# Altium footprint library My Footprint.PcbLib: 268 footprints (part 15 of 17)
Each footprint in its own frame and in the unit in brackets; x right, y up, seen from the top. Pads: shape width x height; smd on the part's side, far side on the other; paste and mask are expansions set on the pad; w line width, h text height; cw(c..) or ccw(c..) is an arc to the next point about the centre after c.
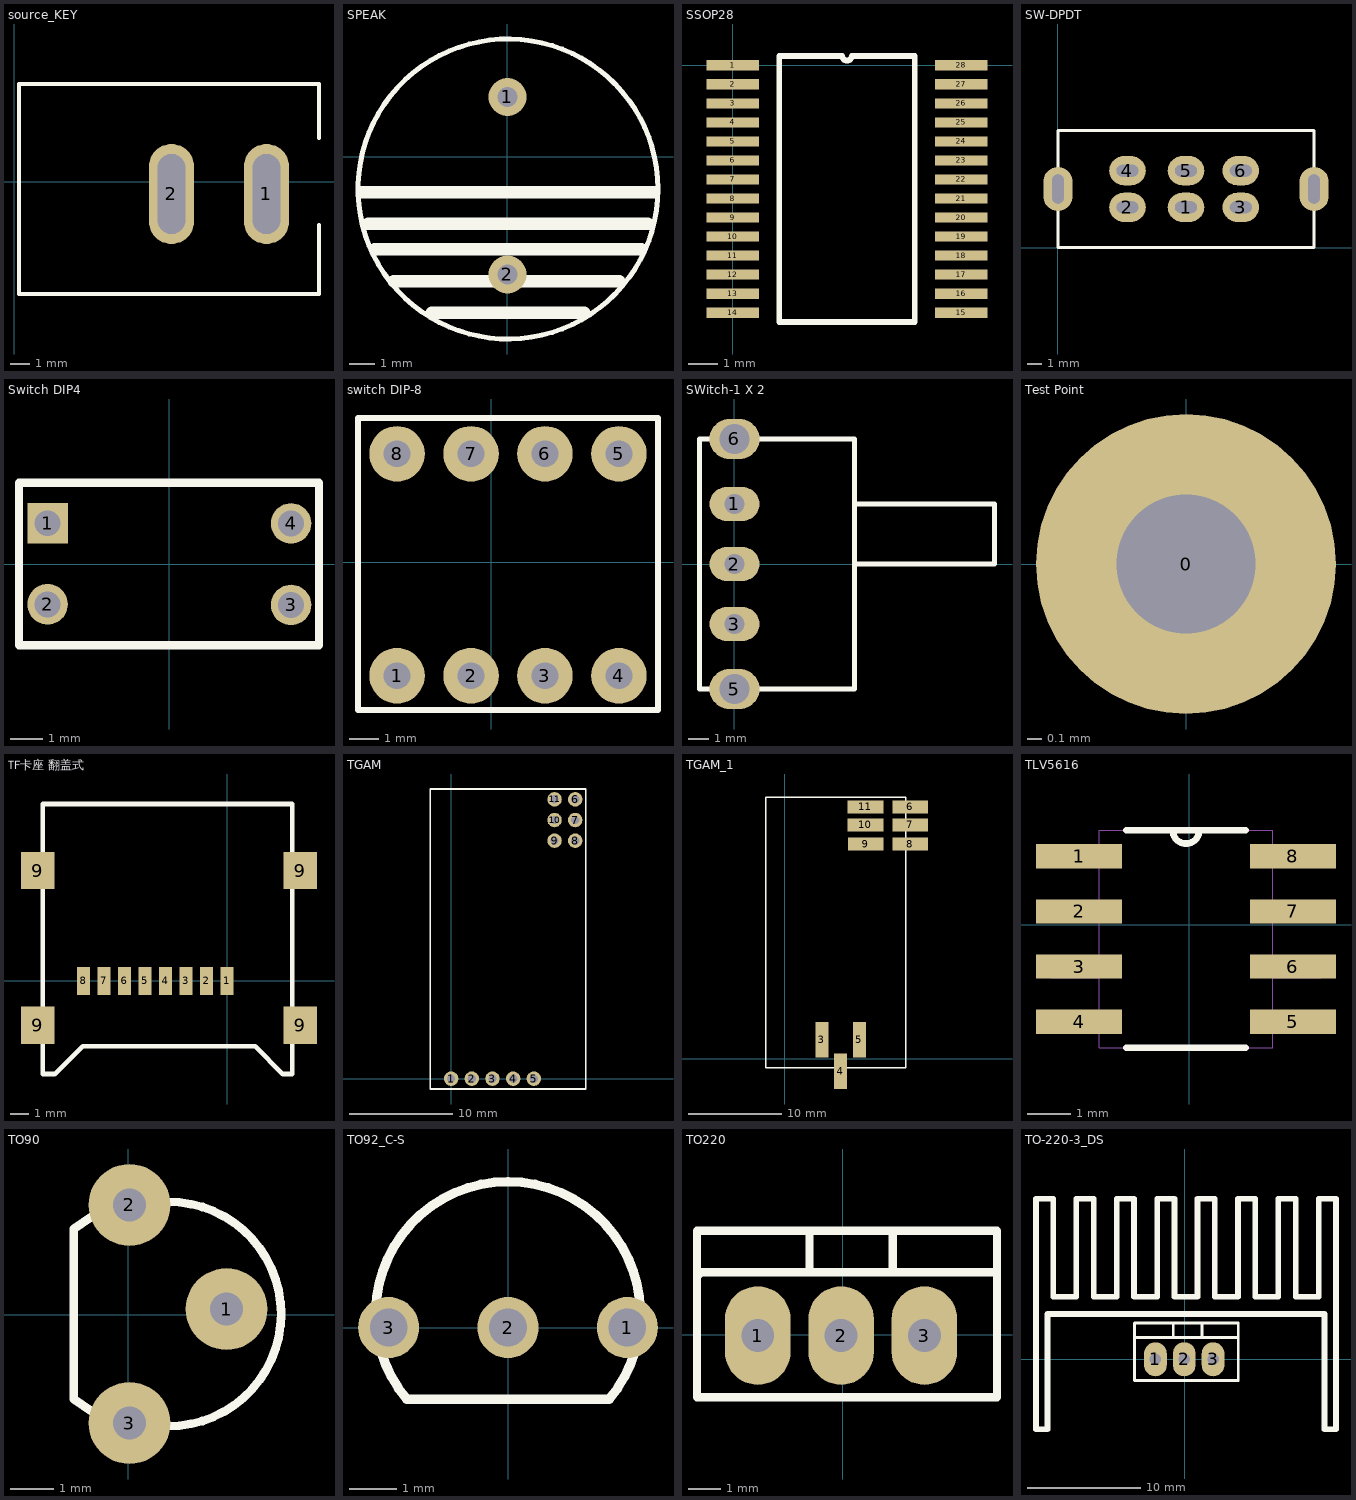
[diagram p14: the footprints below, top view; thin cyan lines are the x and y axes]

## source_KEY [mil] "电源开关"
height 68.9
pads (2):
  oval 90x200 hole 55 slot 160 at 90 deg: 1(505,-25) 2(315,-25)
Top Overlay:
  lines w7.87: 326.77,-225 10,-225 10,195 610,195 610,86.61 ; 330,-225 610,-225 610,-86.61
Mechanical 1:
  lines w39.37: 315.28,-64.37 315.28,14.37 ; 505,-73.43 505,25
Mechanical 2:
  lines w79.37: 315.28,-64.37 315.28,14.37 ; 505,-75 505,23.43
3D body "User Library-KCD11.STEP": height 552.52, standoff -195.91, extent 13.57,-223.39 606.43,190

## SPEAK [mil]
pads (2):
  round 60 hole 31.5: 1(0,94.49) 2(0,-185)
Top Overlay:
  circle w7.87: c0.84,-50.42 r236.22
  lines w19.68: -229.16,-55.43 230.84,-55.43 ; -219.16,-105.43 220.84,-105.43 ; -209.16,-145.43 210.84,-145.43 ; -179.16,-195.43 175.84,-195.43 ; -119.16,-245.43 120.84,-245.43
3D body "D7_12.STEP": height 354.33, standoff -78.74, extent -236.24,-281.22 236.21,191.22

## SSOP28 [mm]
pads (28):
  rect 1.8x0.35 smd: 1(0,0) 2(0,-0.65) 3(0,-1.3) 4(0,-1.95) 5(0,-2.6) 6(0,-3.25) 7(0,-3.9) 8(0,-4.55) 9(0,-5.2) 10(0,-5.85) 11(0,-6.5) 12(0,-7.15) 13(0,-7.8) 14(0,-8.45) 15(7.8,-8.45) 16(7.8,-7.8) 17(7.8,-7.15) 18(7.8,-6.5) 19(7.8,-5.85) 20(7.8,-5.2) 21(7.8,-4.55) 22(7.8,-3.9) 23(7.8,-3.25) 24(7.8,-2.6) 25(7.8,-1.95) 26(7.8,-1.3) 27(7.8,-0.65) 28(7.8,0)
Top Overlay:
  lines w0.2: 1.585,-8.775 1.585,0.325 3.738,0.325 ccw(c3.9,0.325) 4.062,0.325 6.215,0.325 6.215,-8.775 1.585,-8.775
3D body "TSSOP-28.STEP": height 1.03, standoff 0.04, extent 0.737,-9.092 7.137,0.608

## SW-DPDT [mm]
pads (8):
  oval 2.5x2 hole 0.8 slot 1.5 at 0 deg: 1(8.75,2.75) 2(4.75,2.75) 3(12.5,2.75) 4(4.75,5.25) 5(8.75,5.25) 6(12.5,5.25)
  oval 2x3 hole 0.8 slot 2 at 90 deg: ""(0,4) ""(17.5,4)
Top Overlay:
  lines w0.2: 0,0 0,8 17.5,8 17.5,0 0,0

## Switch DIP4 [mil]
pads (4):
  rect 50x50 hole 32: 1(-149.68,50.68)
  round 50 hole 32: 2(-149.68,-49.32) 3(150.5,-50) 4(150.5,50.5)
Top Overlay:
  lines w10: -185,-99.82 -185,100.68 -24.68,100.68 185,100.68 185,-99.82 -185,-99.82

## switch DIP-8 [mil]
pads (8):
  round 75 hole 36: 1(-127.28,-153.54) 2(-27.28,-153.54) 3(72.72,-153.54) 4(172.72,-153.54) 5(172.72,146.46) 6(72.72,146.46) 7(-27.28,146.46) 8(-127.28,146.46)
Top Overlay:
  lines w7.87: -180.04,-200 -180.04,-28.54 -180.04,21.46 -180.04,195 225.47,195 225.47,-200 -180.04,-200
3D body "SWITCH DIP-4.STEP": height 275.59, standoff -145.67, extent -199.69,-200 239.69,189.77

## SWitch-1 X 2 [mm] "卧式开关"
pads (5):
  oval 2.5x1.7 hole 1: 1(0,3) 2(0,0) 3(0,-3)
  oval 2.5x2 hole 1.5: 5(0,-6.25) 6(0,6.25)
Top Overlay:
  lines w0.254: 6,0 13,0 13,3 6,3 ; -1.75,-6.25 0,-6.25 6,-6.25 6,6.25 0,6.25 -1.5,6.25 -1.75,6.25 -1.75,-6.25
3D body "User Library-SLIDE SWITCH SS12F23.STEP": height 5.75, standoff -3.35, extent -0.608,-6.523 12.292,6.477

## Test Point [mil]
pads (1):
  round 80 hole 37: 0(0,0)

## TF卡座 翻盖式 [mm]
height 2
pads (12):
  rect 0.7x1.5 smd: 1(0,0) 2(-1.1,0) 3(-2.2,0) 4(-3.3,0) 5(-4.4,0) 6(-5.5,0) 7(-6.6,0) 8(-7.7,0)
  rect 1.8x2 smd: 9(-10.168,-2.378) 9(-10.168,5.922) 9(3.932,-2.378) 9(3.932,5.922)
Top Overlay:
  lines w0.254: -9.9,-5 -9.9,9.5 0,9.5 3.5,9.5 3.5,-5 3,-5 1.5,-3.5 -7.75,-3.5 -9.25,-5 -9.9,-5
3D body "User Library-5009010801.STEP": height 1.93, standoff -0.02, extent -10.5,-5 4.1,9.5

## TGAM [mm]
pads (11):
  round 1.4 hole 0.8: 1(0,0) 2(2,0) 3(4,0) 4(6,0) 5(8,0) 6(12,27) 7(12,25) 8(12,23) 9(10,23) 10(10,25) 11(10,27)
Top Overlay:
  lines w0.145: -2,-1 -2,28 13,28 13,-1 -2,-1

## TGAM_1 [mil]
pads (9):
  rect 55.12x150 smd: 3(157,79) 4(236,-53) 5(315,79)
  rect 150x55.12 smd: 6(529,1062) 7(529,986) 8(530,905) 9(342,905) 10(341,986) 11(341,1062)
Top Overlay:
  lines w5.71: -78.74,-39.37 -78.74,1102.36 511.81,1102.36 511.81,-39.37 -78.74,-39.37

## TLV5616 [mil]
pads (8):
  rect 78x22 smd: 1(-100,62) 2(-100,12) 3(-100,-38) 4(-100,-88) 5(94,-88) 6(94,-38) 7(94,12) 8(94,62)
Top Overlay:
  lines w6: -57.08,-111.5 51.08,-111.5 ; -57.08,85.5 51.08,85.5 ; -15,85.5 ccw(c-3,85.5) 9,85.5
Mechanical 1:
  lines w0: -15,85.5 ccw(c-3,85.5) 9,85.5 ; -125,-98 -81.5,-98 -81.5,-78 -125,-78 -125,-98 ; -125,-48 -81.5,-48 -81.5,-28 -125,-28 -125,-48 ; -125,2 -81.5,2 -81.5,22 -125,22 -125,2 ; -125,52 -81.5,52 -81.5,72 -125,72 -125,52 ; -81.5,-111.5 -81.5,85.5 75.5,85.5 75.5,-111.5 -81.5,-111.5 ; 75.5,-98 119,-98 119,-78 75.5,-78 75.5,-98 ; 75.5,-48 119,-48 119,-28 75.5,-28 75.5,-48 ; 75.5,2 119,2 119,22 75.5,22 75.5,2 ; 75.5,52 119,52 119,72 75.5,72 75.5,52
3D body "D0008A.stp": height 64.61, standoff 0.63, extent -122.1,-108.46 114.12,84.46

## TO90 [mil] "TO-90三极管引脚"
pads (3):
  round 75 hole 30: 1(90,5) 2(1,100.5) 3(1,-99.5)
Top Overlay:
  lines w7.87: -33.71,-88.58 -50,-77.72 -50,78.72 -33.71,89.58 ; 35.85,-102.26 ccw(c37.23,0.5) 35.85,103.26
3D body "TO-92B.STEP": height 288.98, standoff -27.56, extent -54.8,-105 94.8,118.62

## TO92_C-S [mm] "三极管类引脚横向展开"
height 10
pads (3):
  round 1.3 hole 0.8: 1(2.54,0) 2(0,0) 3(-2.54,0)
Top Overlay:
  lines w0.2: -2.157,-1.522 cw(c0,0.288) 2.157,-1.522 -2.157,-1.522
3D body "User Library-TO-92-4.step": height 10.33, standoff -7.7, extent -2.888,-1.53 2.852,2.66

## TO220 [mm] "MOS 功率三极管封装"
pads (3):
  oval 2x3 hole 1: 1(-2.593,-0.022) 2(-0.053,-0.022) 3(2.487,-0.022)
Top Overlay:
  lines w0.254: -4.445,1.524 -4.445,2.794 -4.445,3.175 4.699,3.175 4.699,1.651 ; -1.016,2.032 -1.016,3.175 ; 1.524,1.905 1.524,3.048 ; 4.572,1.905 -3.81,1.905 -4.318,1.905 -4.445,1.778 -4.445,-1.905 4.699,-1.905 4.699,1.905
3D body "三?": height 19.3, standoff -4.92, extent -5.207,-1.684 4.923,3.716

## TO-220-3_DS [mm] "大散热片的封装"
pads (3):
  oval 2x3 hole 1: 1(-2.593,-0.022) 2(-0.053,-0.022) 3(2.487,-0.022)
Top Overlay:
  lines w0.254: -4.445,1.524 -4.445,2.794 -4.445,3.175 4.699,3.175 4.699,1.651 ; -1.016,2.032 -1.016,3.175 ; 1.524,1.905 1.524,3.048 ; 4.572,1.905 -3.81,1.905 -4.318,1.905 -4.445,1.778 -4.445,-1.905 4.699,-1.905 4.699,1.905
  lines w0.5: -13.106,-6.194 -12.09,-6.194 -12.09,3.966 11.278,3.966 12.294,3.966 12.294,-6.194 13.31,-6.194 13.31,14.126 11.786,14.126 11.786,5.49 11.278,5.49 10.77,5.49 9.754,5.49 9.754,14.126 8.23,14.126 8.23,5.49 6.198,5.49 6.198,14.126 4.674,14.126 4.674,5.49 2.642,5.49 2.642,14.126 1.118,14.126 1.118,5.49 -0.914,5.49 -0.914,14.126 -2.438,14.126 -2.438,5.49 -4.47,5.49 -4.47,14.126 -5.994,14.126 -5.994,5.49 -8.026,5.49 -8.026,14.126 -8.534,14.126 -9.55,14.126 -9.55,5.49 -10.058,5.49 -11.582,5.49 -11.582,14.126 -13.106,14.126 -13.106,3.966 -13.106,-6.194
3D body "三?": height 19.3, standoff -4.92, extent -5.207,-1.684 4.923,3.716
3D body "TO220-HS201-20.STEP": height 21.27, standoff 1.27, extent -11.43,-2.801 12.07,12.199